# Altium footprint library ESKDPcbLib.PcbLib: 608 footprints (part 1 of 38)
Each footprint in its own frame and in the unit in brackets; x right, y up, seen from the top. Pads: shape width x height; smd on the part's side, far side on the other; paste and mask are expansions set on the pad; w line width, h text height; cw(c..) or ccw(c..) is an arc to the next point about the centre after c.
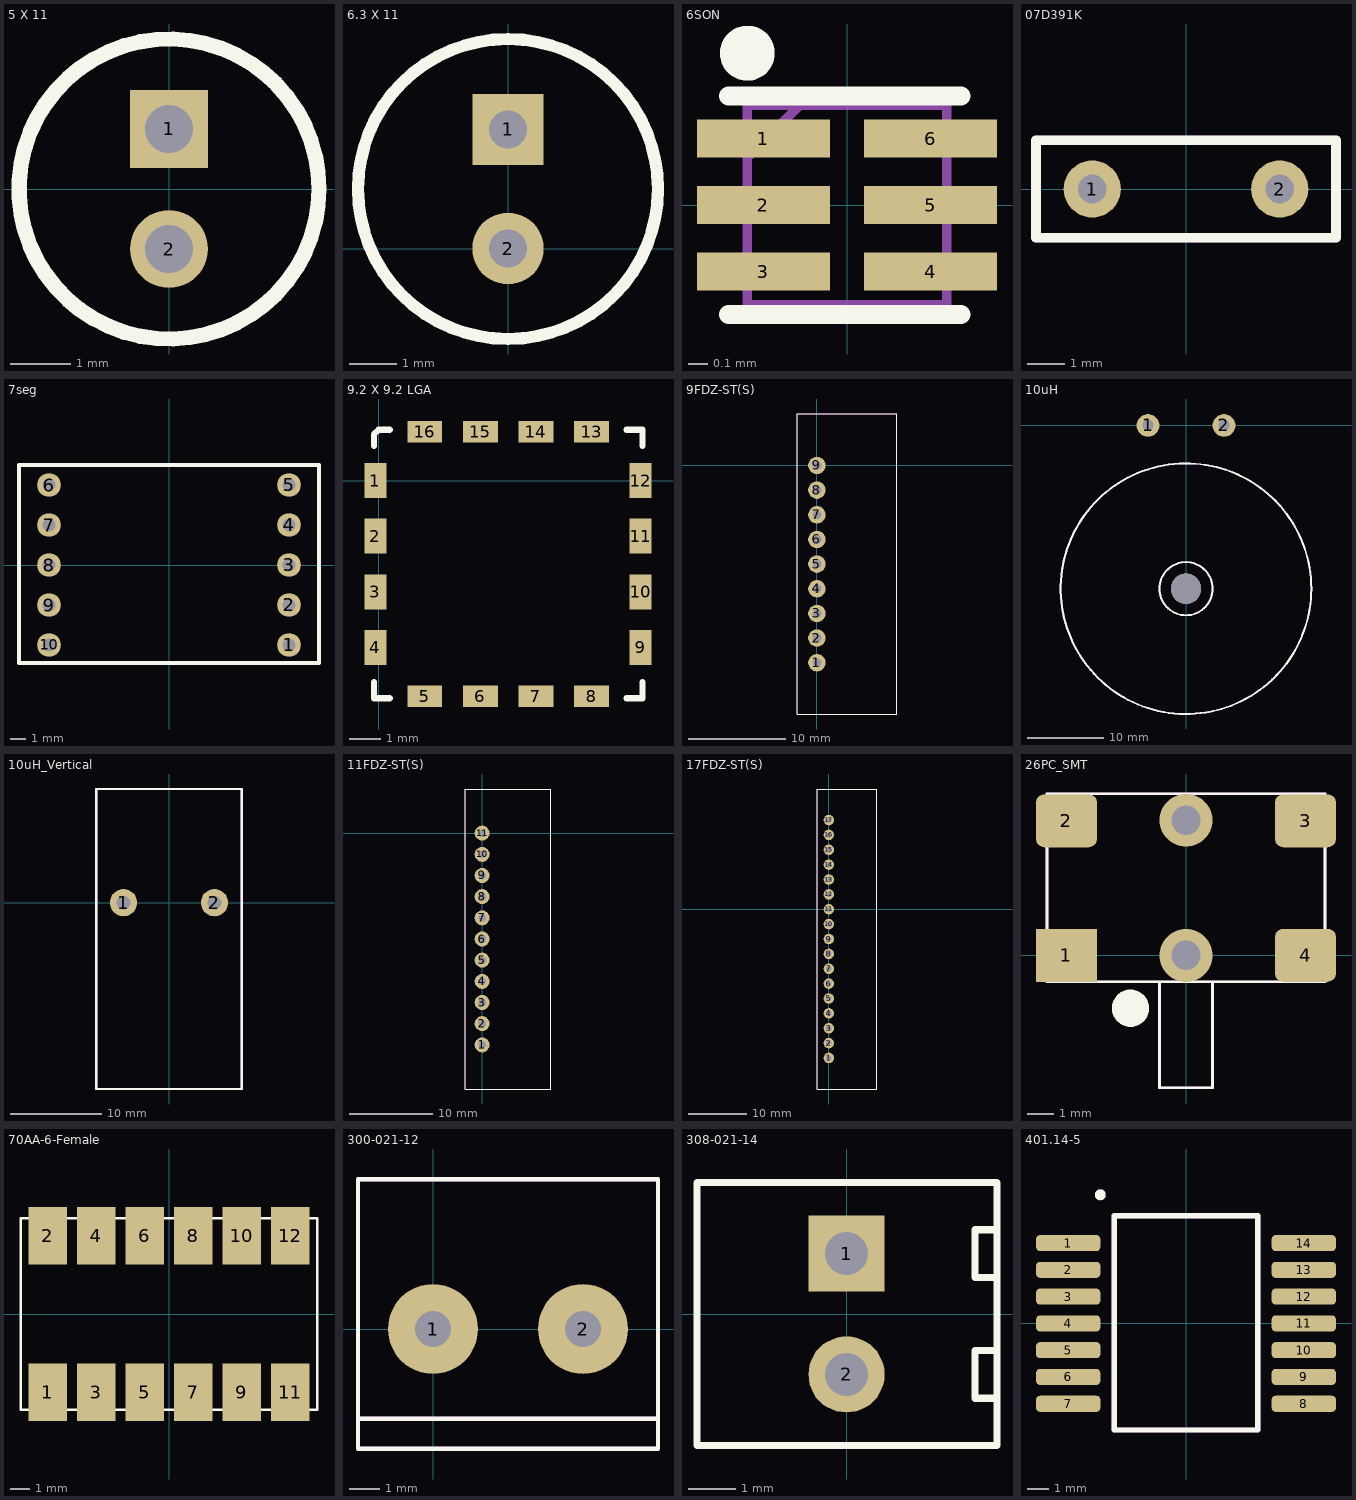
[diagram p0: the footprints below, top view; thin cyan lines are the x and y axes]

## 5 X 11 [mm]
pads (2):
  rect 1.3x1.3 hole 0.8: 1(0,1)
  round 1.3 hole 0.8: 2(0,-1)
Top Overlay:
  circle w0.254: c0,0 r2.5
Mechanical 10:
  text ".Comment" at -2.25,3.75 h1.5
  text ".Designator" at -2.25,2.75 h1.5
3D body: height 11, standoff 0, extent -2.494,-2.498 2.5,2.499

## 6.3 X 11 [mm]
pads (2):
  rect 1.5x1.5 hole 0.8: 1(0,2.5)
  round 1.5 hole 0.8: 2(0,0)
Top Overlay:
  circle w0.254: c0,1.25 r3.15
3D body: height 11, standoff 0, extent -3.144,-1.898 3.15,4.399

## 6SON [mm] "PSON, 6-Leads, Body 3x4 mm, Pitch 0.8mm, NSC Recommended"
height 0.4
pads (6):
  rect 0.7x0.2 smd mask+0.051: 1(-0.44,0.35) 2(-0.44,0) 3(-0.44,-0.35) 4(0.44,-0.35) 5(0.44,0) 6(0.44,0.35)
Top Overlay:
  circle w0.15: c-0.525,0.8 r0.069
  lines w0.1: -0.625,-0.575 0.6,-0.575 ; -0.625,0.575 0.6,0.575
Mechanical 7:
  lines w0.05: -0.513,0.262 -0.25,0.525 -0.2,0.525 ; -0.525,-0.525 0.525,-0.525 0.525,0.525 -0.525,0.525 -0.525,-0.525
Mechanical 9:
  lines w0.05: -0.525,-0.525 -0.525,0.525 0.525,0.525 0.525,-0.525 -0.525,-0.525
Mechanical 10:
  text ".Designator" at -1,-1.125 h0.6
  text ".Comment" at -1,1 h0.6
3D body: height 0.4, standoff 0.05, extent -0.525,-0.525 0.525,0.525

## 07D391K [mil] "Varystor"
pads (2):
  round 60 hole 30: 1(-98.43,0) 2(98.43,0)
Top Overlay:
  lines w10: -157.48,-51.18 157.48,-51.18 157.48,51.18 -157.48,51.18 -157.48,-51.18
Mechanical 7:
  lines w10: -157.48,-51.18 157.48,-51.18 157.48,51.18 -157.48,51.18 -157.48,-51.18
Mechanical 10:
  text ".Comment" at -137.8,59.05 h39.37
  text ".Designator" at -137.8,98.43 h39.37
3D body "Warystor_5mm.STEP": height 413.39, standoff -81.38, extent -157.48,-49.6 157.49,49.22

## 7seg [mm]
pads (10):
  round 1.5 hole 0.8: 1(7.62,-5.08) 2(7.62,-2.54) 3(7.62,0) 4(7.62,2.54) 5(7.62,5.08) 6(-7.62,5.08) 7(-7.62,2.54) 8(-7.62,0) 9(-7.62,-2.54) 10(-7.62,-5.08)
Top Overlay:
  lines w0.254: -9.525,-6.223 9.525,-6.223 9.525,6.35 -9.525,6.35 -9.525,-6.223
Mechanical 7:
  lines w0.254: -9.525,-6.223 9.525,-6.223 9.525,6.35 -9.525,6.35 -9.525,-6.223
Mechanical 10:
  text ".Designator" at -9.176,7.706 h1
  text ".Comment" at -9.176,6.706 h1
3D body "7seg.STEP": height 8, standoff -3.5, extent -9.5,-6.25 9.5,6.35

## 9.2 X 9.2 LGA [mm]
pads (16):
  rect 0.7x1.127 smd: 1(-0.1,0) 2(-0.1,-1.797) 3(-0.1,-3.594) 4(-0.1,-5.391) 9(8.463,-5.391) 10(8.463,-3.594) 11(8.463,-1.797) 12(8.463,0)
  rect 1.127x0.7 smd: 5(1.491,-6.972) 6(3.288,-6.972) 7(5.085,-6.972) 8(6.882,-6.972) 13(6.882,1.581) 14(5.085,1.581) 15(3.288,1.581) 16(1.491,1.581)
Top Overlay:
  lines w0.2: -0.15,-6.518 -0.15,-7.032 0.364,-7.032 ; -0.15,1.127 -0.15,1.491 0,1.641 0.364,1.641 ; 8.009,-7.032 8.523,-7.032 8.523,-6.518 ; 8.009,1.641 8.523,1.641 8.523,1.127
3D body: height 3.9, standoff 0, extent -0.4,-7.3 8.8,1.9

## 9FDZ-ST(S) [mm]
pads (9):
  round 1.8 hole 0.9 mask+0: 1(0,-20.32) 2(0,-17.78) 3(0,-15.24) 4(0,-12.7) 5(0,-10.16) 6(0,-7.62) 7(0,-5.08) 8(0,-2.54) 9(0,0)
Top Overlay:
  lines w0.1: -2,-25.6 8.2,-25.6 8.2,5.3 -2,5.3 -2,-25.6
Mechanical 7:
  lines w0.1: -2,-25.6 -2,5.3 8.2,5.3 8.2,-25.6 -2,-25.6
Mechanical 10:
  text ".Comment" at 4.9,5.7 h0.6
  text ".Designator" at 4.8,6.5 h0.8
3D body: height 7.7, standoff 0, extent -2,-25.6 8.2,5.3

## 10uH [mm] "для усилителя"
pads (3):
  round 3 hole 1.5: 1(-5,0) 2(5,0)
  round 4 hole 4 unplated: ""(0,-21.5)
Top Overlay:
  circle w0.254: c0,-21.5 r16.5
  circle w0.254: c0,-21.5 r3.5
Mechanical 7:
  circle w0.254: c0,-21.5 r3.5
  circle w0.254: c0,-21.5 r16.5
3D body: height 16, standoff 0, extent -16.5,-37.995 16.5,-5.004

## 10uH_Vertical [mm] "для усилителя"
pads (2):
  round 3 hole 1.5: 1(-5,0) 2(5,0)
Top Overlay:
  lines w0.254: -8,-20.5 -8,12.5 8,12.5 8,-20.5 -8,-20.5
Mechanical 7:
  lines w0.254: -8,-20.5 -8,12.5 8,12.5 8,-20.5 -8,-20.5
3D body: height 16.5, standoff -16.5, extent -8,-20.495 8,12.495

## 11FDZ-ST(S) [mm]
pads (11):
  round 1.8 hole 0.9 mask+0: 1(0,-25.4) 2(0,-22.86) 3(0,-20.32) 4(0,-17.78) 5(0,-15.24) 6(0,-12.7) 7(0,-10.16) 8(0,-7.62) 9(0,-5.08) 10(0,-2.54) 11(0,0)
Top Overlay:
  lines w0.1: -2,-30.7 -2,5.3 8.2,5.3 8.2,-30.7 -2,-30.7
Mechanical 7:
  lines w0.1: -2,-30.7 8.2,-30.7 8.2,5.3 -2,5.3 -2,-30.7
Mechanical 10:
  text ".Comment" at 3.9,5.7 h0.6
  text ".Designator" at 3.8,6.5 h0.8
3D body: height 7.7, standoff 0, extent -2,-30.7 8.2,5.3

## 17FDZ-ST(S) [mm]
pads (17):
  round 1.8 hole 0.9 mask+0: 1(0,-25.4) 2(0,-22.86) 3(0,-20.32) 4(0,-17.78) 5(0,-15.24) 6(0,-12.7) 7(0,-10.16) 8(0,-7.62) 9(0,-5.08) 10(0,-2.54) 11(0,0) 12(0,2.54) 13(0,5.08) 14(0,7.62) 15(0,10.16) 16(0,12.7) 17(0,15.24)
Top Overlay:
  lines w0.1: -2,-30.7 -2,20.54 8.2,20.54 8.2,-30.7 -2,-30.7
Mechanical 7:
  lines w0.1: -2,-30.7 8.2,-30.7 8.2,20.54 -2,20.54 -2,-30.7
Mechanical 10:
  text ".Comment" at 4.1,21.1 h0.6
  text ".Designator" at 4,21.9 h0.8
3D body: height 7.7, standoff 0, extent -2,-30.7 8.2,20.5

## 26PC_SMT [mm]
height 8
pads (4):
  rect 2.3x2 smd: 1(-4.515,0)
  rrect30% 2.3x2 smd: 2(-4.515,5.08) 3(4.515,5.08) 4(4.515,0)
via 0,5.1 diameter 2 hole 1.1
via 0,0 diameter 2 hole 1.1
Top Overlay:
  circle w1: c-2.1,-2 r0.2
  lines w0.1: -1,-1 -1,-5 1,-5 1,-1 ; -5.25,-1 5.25,-1 5.25,6.1 -5.25,6.1 -5.25,-1
Mechanical 7:
  lines w0.1: -1,-1 -1,-5 1,-5 1,-1 ; -5.25,-1 -5.25,6.1 5.25,6.1 5.25,-1 -5.25,-1
3D body: height 7, standoff 0, extent -1,-5 1,-1
3D body: height 2.75, standoff 0, extent 3.275,-1.1 5.75,1.1
3D body: height 2.75, standoff 0, extent 3.275,4 5.75,6.2
3D body: height 2.75, standoff 0, extent -5.725,4 -3.25,6.2
3D body: height 2.75, standoff 0, extent -5.75,-1.1 -3.275,1.1
3D body: height 7.87, standoff 0, extent -3.4,-1 3.4,6.1

## 70AA-6-Female [mm]
height 1.27
pads (12):
  rect 2x3 smd: 1(-6.35,-4.1) 2(-6.35,4.1) 3(-3.81,-4.1) 4(-3.81,4.1) 5(-1.27,-4.1) 6(-1.27,4.1) 7(1.27,-4.1) 8(1.27,4.1) 9(3.81,-4.1) 10(3.81,4.1) 11(6.35,-4.1) 12(6.35,4.1)
Top Overlay:
  lines w0.127: -7.75,-5 -7.75,5 7.75,5 7.75,-5 -7.75,-5
3D body: height 1.27, standoff -0.84, extent -7.57,-5 7.57,5

## 300-021-12 [mm]
pads (2):
  round 3 hole 1.2: 1(0,0) 2(5,0)
Top Overlay:
  lines w0.15: -2.5,-3 7.5,-3 ; -2.5,-4 7.5,-4 7.5,5 -2.5,5 -2.5,-4
Mechanical 7:
  lines w0.15: -2.5,-3 7.5,-3 ; -2.5,-4 -2.5,5 7.5,5 7.5,-4 -2.5,-4
Mechanical 10:
  text ".Designator" at 4.52,5.25 h0.8
  text ".Comment" at 5.52,-4.71 h0.6
3D body: height 12.5, standoff 0, extent -2.5,-4 7.5,5

## 308-021-14 [mm]
height 8.5
pads (2):
  rect 1.6x1.6 hole 0.9: 1(0,1.27)
  round 1.6 hole 0.9: 2(0,-1.27)
Top Overlay:
  lines w0.15: 3.16,-1.77 2.7,-1.77 2.7,-0.77 3.16,-0.77 ; 3.16,0.77 2.7,0.77 2.7,1.77 3.16,1.77 ; -3.14,-2.765 -3.14,2.765 3.16,2.765 3.16,-2.765 -3.14,-2.765
Mechanical 7:
  lines w0.1: 3.16,-1.77 2.7,-1.77 2.7,-0.77 3.16,-0.77 ; 3.16,0.77 2.7,0.77 2.7,1.77 3.16,1.77 ; -3.14,-2.765 3.16,-2.765 3.16,2.765 -3.14,2.765 -3.14,-2.765
Mechanical 10:
  text ".Comment" at -1.15,3.275 h0.6
  text ".Designator" at -1.175,3.975 h0.8
3D body: height 8.5, standoff 0, extent -3.14,-2.765 3.16,2.765

## 401.14-5 [mm]
pads (14):
  rrect50% 3x0.75 smd: 1(-5.5,3.75) 2(-5.5,2.5) 3(-5.5,1.25) 4(-5.5,0) 5(-5.5,-1.25) 6(-5.5,-2.5) 7(-5.5,-3.75) 8(5.5,-3.75) 9(5.5,-2.5) 10(5.5,-1.25) 11(5.5,0) 12(5.5,1.25) 13(5.5,2.5) 14(5.5,3.75)
Top Overlay:
  circle w0.254: c-4,6 r0.125
  lines w0.254: -3.35,-4.975 -3.35,5.025 3.35,5.025 3.35,-4.975 -3.35,-4.975
Mechanical 7:
  circle w0.254: c-4,6 r0.127
  lines w0.254: -3.35,-4.975 -3.35,5.025 3.35,5.025 3.35,-4.975 -3.35,-4.975
Mechanical 10:
  text ".Designator" at -2.125,6.35 h1
  text ".Comment" at -2.125,5.35 h1
3D body "401.14-5.STEP": height 2.65, standoff 0, extent -6.126,-5 6.125,5